# Altium footprint library 未分类器件.PcbLib: 80 footprints (part 5 of 5)
Each footprint in its own frame and in the unit in brackets; x right, y up, seen from the top. Pads: shape width x height; smd on the part's side, far side on the other; paste and mask are expansions set on the pad; w line width, h text height; cw(c..) or ccw(c..) is an arc to the next point about the centre after c.
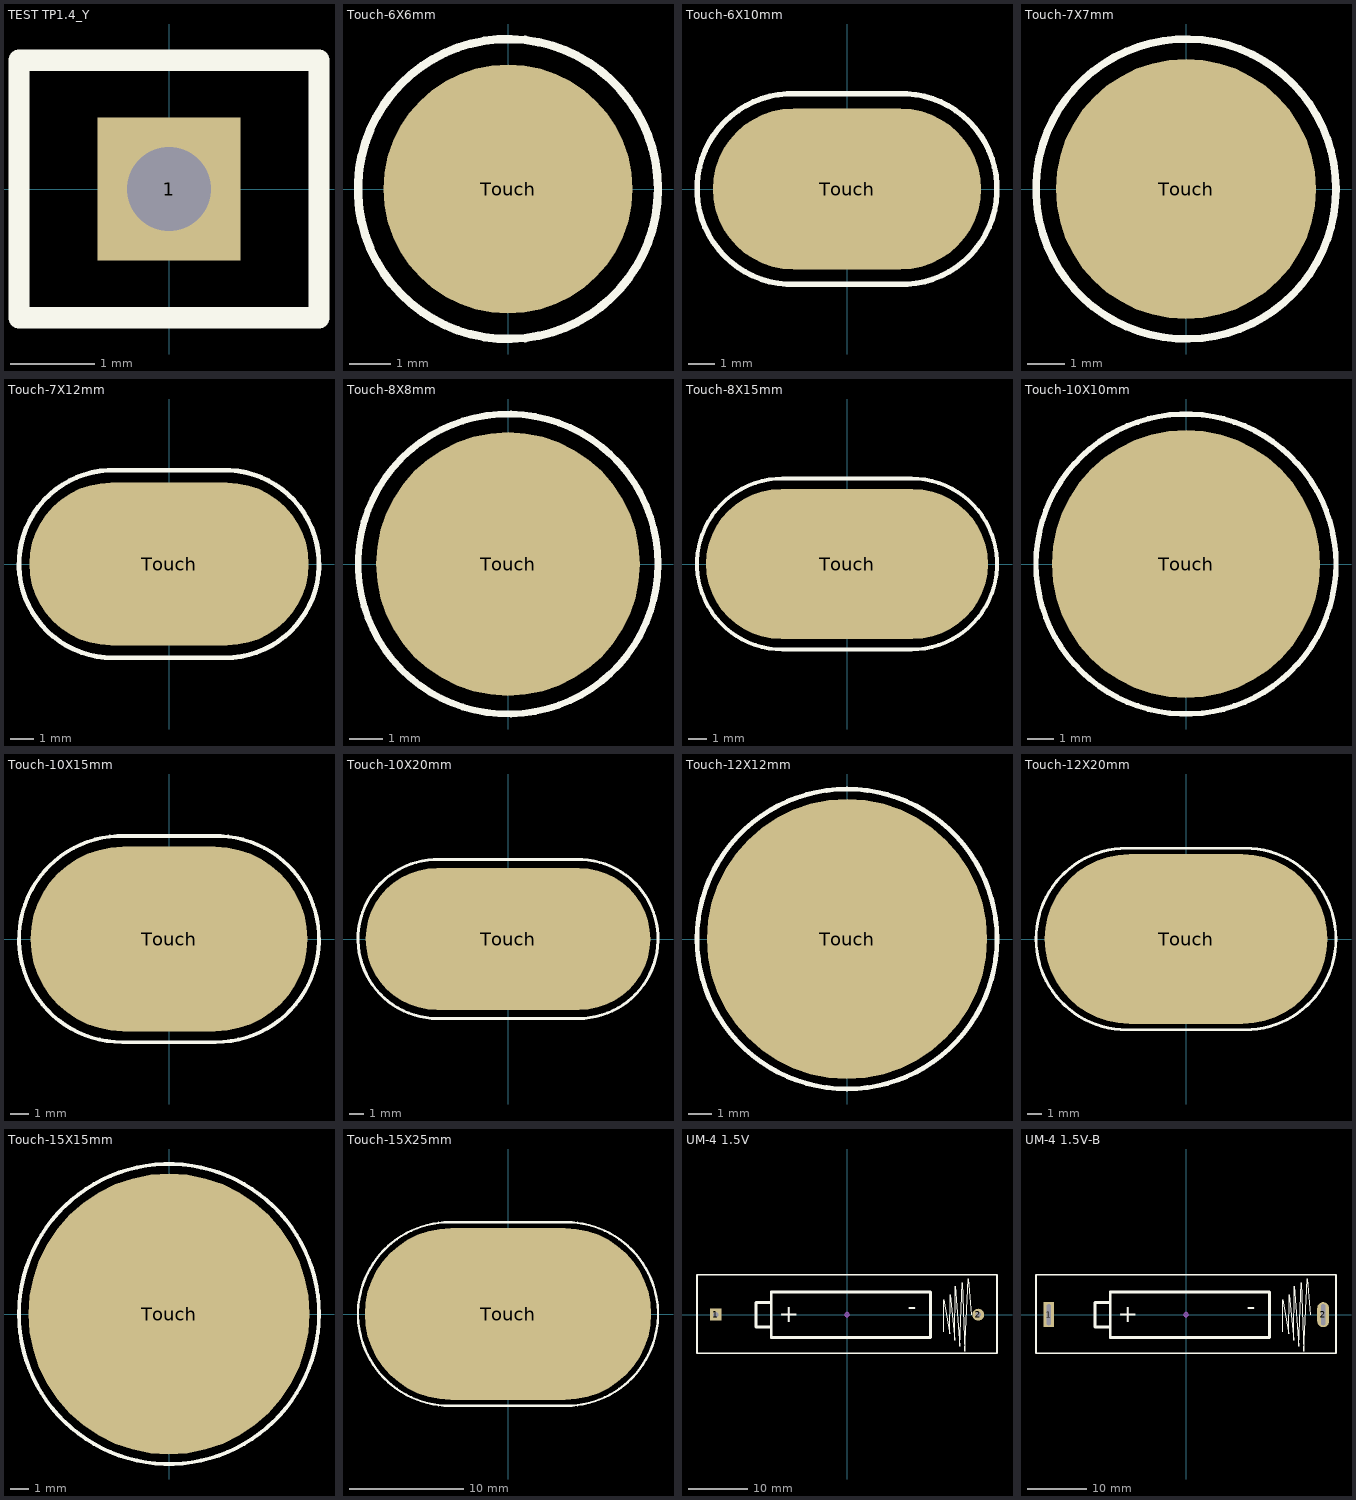
[diagram p4: the footprints below, top view; thin cyan lines are the x and y axes]

## TEST TP1.4_Y [mm] "黄色，测试环"
pads (1):
  rect 1.7x1.7 hole 1: 1(0,0)
Top Overlay:
  lines w0.254: -1.778,-1.524 1.778,-1.524 1.778,1.524 -1.778,1.524 -1.778,-1.524
3D body: height 5.41, standoff -3.15, extent -1.675,-1.4 1.675,1.4

## Touch-6X6mm [mm] "触摸焊盘6mm*6mm"
pads (1):
  round 6 smd paste-6 mask+0.5: Touch(0,0)
Top Overlay:
  circle w0.203: c0,0 r3.61
Keep-Out Layer:
  circle w0.1: c0,0 r1.5

## Touch-6X10mm [mm] "触摸焊盘6mm*10mm"
pads (1):
  oval 10x6 smd paste-6 mask+0.5: Touch(0,0)
Top Overlay:
  lines w0.203: -1.921,-3.557 cw(c-2.032,0) -1.905,3.556 1.905,3.556 cw(c2.032,0) 1.921,-3.557 -1.921,-3.557
Keep-Out Layer:
  circle w0.1: c0,0 r1.5

## Touch-7X7mm [mm] "触摸焊盘7mm*7mm"
pads (1):
  round 7 smd paste-7 mask+0.5: Touch(0,0)
Top Overlay:
  circle w0.203: c0,0 r4.034
Keep-Out Layer:
  circle w0.1: c0,0 r1.5

## Touch-7X12mm [mm] "触摸焊盘7mm*12mm"
pads (1):
  oval 12x7 smd paste-7 mask+0.5: Touch(0,0)
Top Overlay:
  lines w0.203: -2.413,-4.034 cw(c-2.413,0) -2.287,4.032 2.287,4.032 cw(c2.413,0) 2.413,-4.034 -2.413,-4.034
Keep-Out Layer:
  circle w0.1: c0,0 r1.5

## Touch-8X8mm [mm] "触摸焊盘8mm*8mm"
pads (1):
  round 8 smd paste-8 mask+0.5: Touch(0,0)
Top Overlay:
  circle w0.203: c0,0 r4.553
Keep-Out Layer:
  circle w0.1: c0,0 r1.5

## Touch-8X15mm [mm] "触摸焊盘8mm*15mm"
pads (1):
  oval 15x8 smd paste-8 mask+0.5: Touch(0,0)
Top Overlay:
  lines w0.203: -3.429,-4.553 cw(c-3.429,0) -3.429,4.553 3.429,4.553 cw(c3.429,0) 3.429,-4.553 -3.429,-4.553
Keep-Out Layer:
  circle w0.1: c0,0 r1.5

## Touch-10X10mm [mm] "触摸焊盘10mm*10mm"
pads (1):
  round 10 smd paste-10 mask+0.5: Touch(0,0)
Top Overlay:
  circle w0.203: c0,0 r5.589
Keep-Out Layer:
  circle w0.1: c0,0 r1.5

## Touch-10X15mm [mm] "触摸焊盘10mm*15mm"
pads (1):
  oval 15x10 smd paste-10 mask+0.5: Touch(0,0)
Top Overlay:
  lines w0.203: -2.54,-5.589 cw(c-2.54,0) -2.393,5.588 2.393,5.588 cw(c2.54,0) 2.54,-5.589 -2.54,-5.589
Keep-Out Layer:
  circle w0.1: c0,0 r1.5

## Touch-10X20mm [mm] "触摸焊盘10mm*20mm"
pads (1):
  oval 20x10 smd paste-10 mask+0.5: Touch(0,0)
Top Overlay:
  lines w0.203: -4.953,-5.589 cw(c-4.953,0) -4.806,5.588 4.806,5.588 cw(c4.953,0) 4.953,-5.589 -4.953,-5.589
Keep-Out Layer:
  circle w0.1: c0,0 r1.5

## Touch-12X12mm [mm] "触摸焊盘12mm*12mm"
pads (1):
  round 12 smd paste-12 mask+0.5: Touch(0,0)
Top Overlay:
  circle w0.203: c0,0 r6.422
Keep-Out Layer:
  circle w0.1: c0,0 r1.5

## Touch-12X20mm [mm] "触摸焊盘12mm*20mm"
pads (1):
  oval 20x12 smd paste-12 mask+0.5: Touch(0,0)
Top Overlay:
  lines w0.203: -4.191,-6.422 cw(c-4.191,0) -4.191,6.422 4.191,6.422 cw(c4.191,0) 4.191,-6.422 -4.191,-6.422
Keep-Out Layer:
  circle w0.1: c0,0 r1.5

## Touch-15X15mm [mm] "触摸焊盘15mm*15mm"
pads (1):
  round 15 smd paste-15 mask+0.5: Touch(0,0)
Top Overlay:
  circle w0.203: c0,0 r8.009
Keep-Out Layer:
  circle w0.1: c0,0 r1.5

## Touch-15X25mm [mm] "触摸焊盘15mm*25mm"
pads (1):
  oval 25x15 smd paste-15 mask+0.5: Touch(0,0)
Top Overlay:
  lines w0.203: -5.08,-8.009 cw(c-5.08,0) -5.08,8.009 5.08,8.009 cw(c5.08,0) 5.08,-8.009 -5.08,-8.009
Keep-Out Layer:
  circle w0.1: c0,0 r1.5

## UM-4 1.5V [mm] "7号电池盒"
height 10
pads (2):
  rect 2x2 hole 0.9: 1(-22,0.001)
  round 2 hole 0.85: 2(22,-0.001)
Top Overlay:
  lines w0.2: 16.25,-2.894 16.25,2.516 17.266,-3.174 17.291,3.303 18.104,-4.317 18.18,4.776 18.917,-5.307 19.323,5.386 19.78,-6.095 20.339,6.046 20.847,-0.024
  lines w0.254: -25.146,-6.501 -25.146,6.731 25.146,6.731 25.146,-6.501 -25.146,-6.501
  lines w0.5: -12.7,-2.032 -15.24,-2.032 -15.24,2.032 -12.7,2.032 ; -12.7,-2.032 -12.7,-3.81 13.97,-3.81 13.97,3.81 -12.7,3.81 -12.7,2.032 ; -12.7,-2.032 -12.7,2.032
  text "+" at -11.43,-1.27 h3
  text "-" at 10.16,0 h3
Mechanical 15:
  circle w0.05: c0,0 r0.35
  lines w0.05: -0.5,0 0.5,0 ; 0,-0.5 0,0.5
3D body: height 12.55, standoff -3.55, extent -25,-6.65 25,6.65

## UM-4 1.5V-B [mm] "7号电池盒"
height 10
pads (2):
  rect 1.8x4.2 hole 0.7 slot 3.5 at 90 deg: 1(-23,0)
  oval 2x4.2 hole 0.7 slot 3.5 at 90 deg: 2(23,0)
Top Overlay:
  lines w0.2: 16.25,-2.894 16.25,2.516 17.266,-3.174 17.291,3.303 18.104,-4.317 18.18,4.776 18.917,-5.307 19.323,5.386 19.78,-6.095 20.339,6.046 20.847,-0.024
  lines w0.254: -25.146,-6.501 -25.146,6.731 25.146,6.731 25.146,-6.501 -25.146,-6.501
  lines w0.5: -12.7,-2.032 -15.24,-2.032 -15.24,2.032 -12.7,2.032 ; -12.7,-2.032 -12.7,-3.81 13.97,-3.81 13.97,3.81 -12.7,3.81 -12.7,2.032 ; -12.7,-2.032 -12.7,2.032
  text "+" at -11.43,-1.27 h3
  text "-" at 10.16,0 h3
Mechanical 15:
  circle w0.05: c0,0 r0.35
  lines w0.05: -0.5,0 0.5,0 ; 0,-0.5 0,0.5
3D body: height 12.55, standoff -3.95, extent -25,-6.65 25,6.65